# Altium footprint library DaughterBoard.PcbLib: 103 footprints (part 5 of 7)
Each footprint in its own frame and in the unit in brackets; x right, y up, seen from the top. Pads: shape width x height; smd on the part's side, far side on the other; paste and mask are expansions set on the pad; w line width, h text height; cw(c..) or ccw(c..) is an arc to the next point about the centre after c.
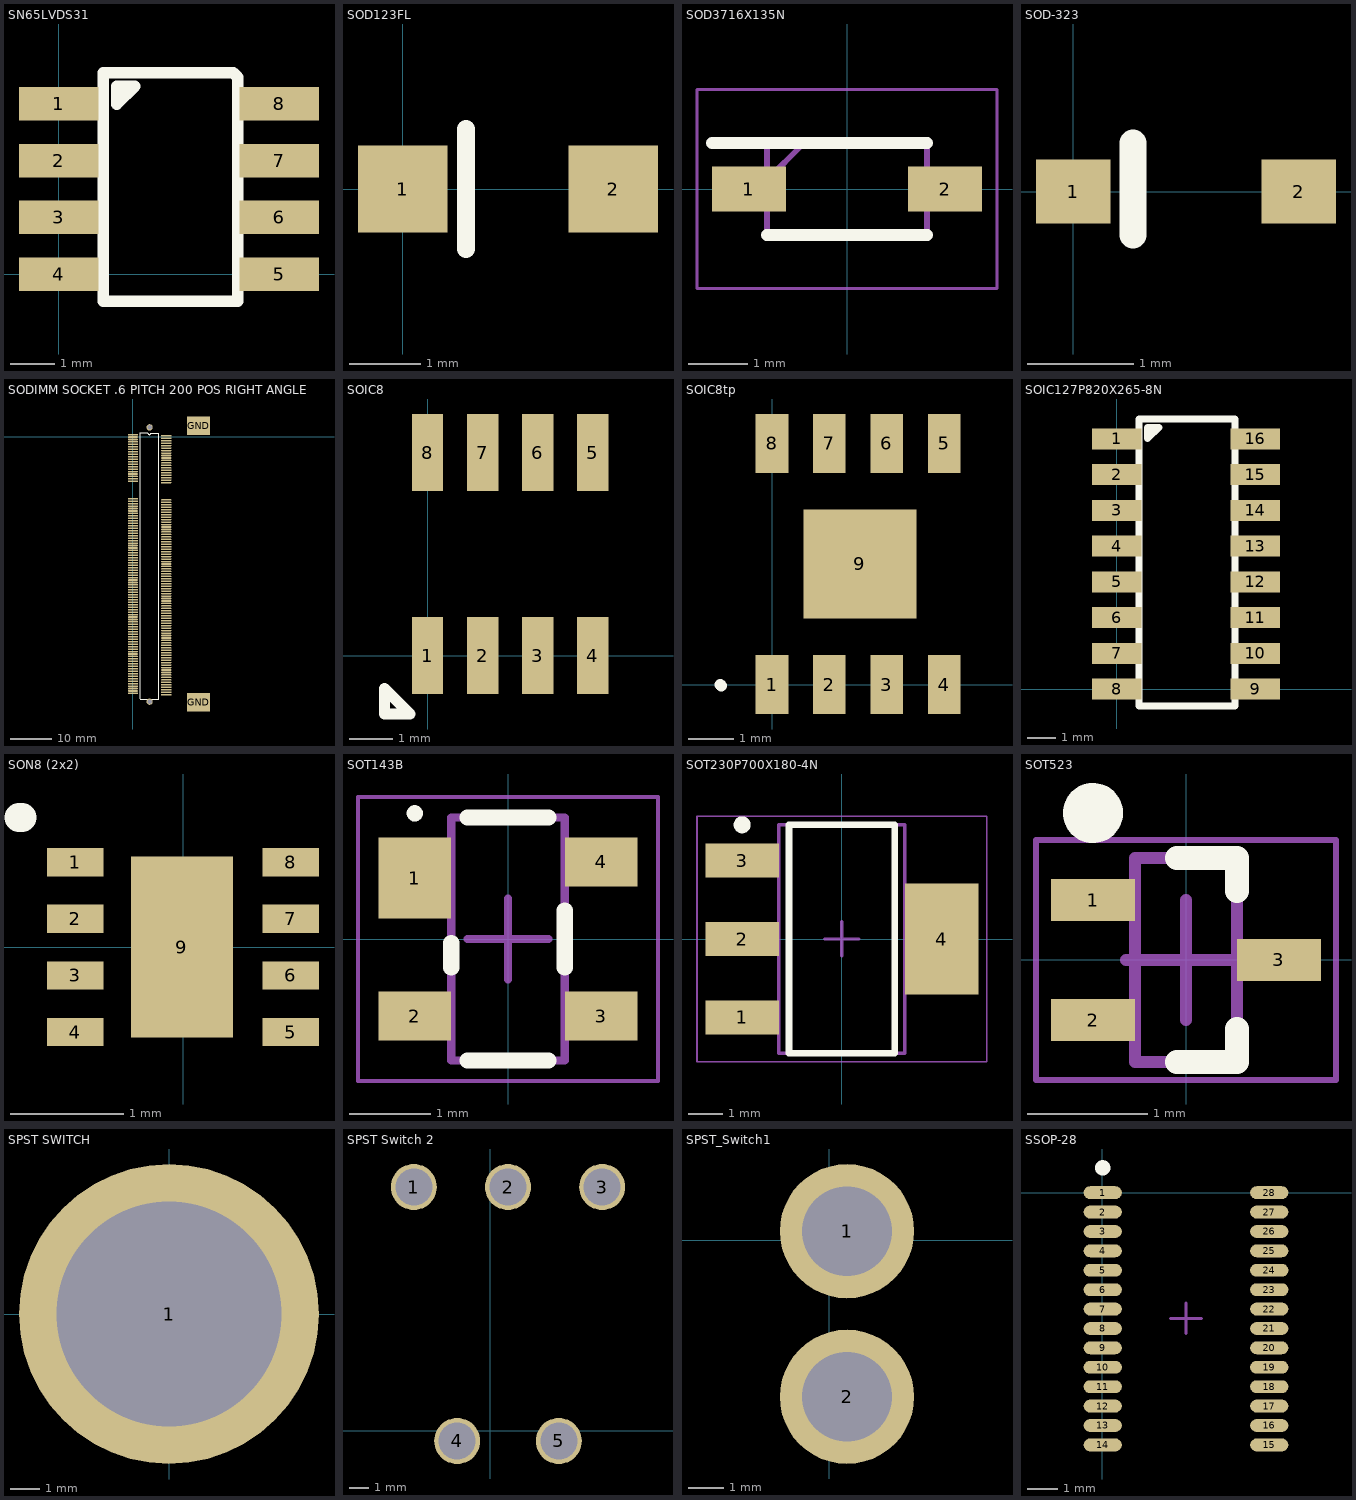
[diagram p4: the footprints below, top view; thin cyan lines are the x and y axes]

## SN65LVDS31 [mm]
pads (8):
  rect 1.77x0.75 smd: 1(0,3.81) 2(0,2.54) 3(0,1.27) 4(0,0) 5(4.928,0) 6(4.928,1.27) 7(4.928,2.54) 8(4.928,3.81)
Top Overlay:
  lines w0.254: 1,-0.6 4,-0.6 4,4.4 3.9,4.5 1,4.5 1,-0.6 ; 1.3,3.8 1.3,4.2 1.7,4.2 1.3,3.8
3D body "D8.stp": height 1.76, standoff 0, extent -0.599,-0.602 5.599,4.402

## SOD123FL [mm]
pads (2):
  rect 1.25x1.22 smd: 1(0,0) 2(2.95,0)
Top Overlay:
  lines w0.254: 0.889,-0.838 0.889,0.838
3D body "User Library-SOD-123FL CASE 498.step": height 0.95, standoff 0, extent -0.276,-0.825 3.324,0.825

## SOD3716X135N [mm]
pads (2):
  rect 1.25x0.75 smd: 1(-1.65,0) 2(1.65,0)
Top Overlay:
  lines w0.2: -2.275,0.775 1.35,0.775 ; -1.35,-0.775 1.35,-0.775
Mechanical 13:
  lines w0.1: -1.35,0.15 -0.725,0.775 ; -1.35,-0.775 -1.35,0.775 1.35,0.775 1.35,-0.775 -1.35,-0.775
Mechanical 15:
  lines w0.05: -2.525,-1.675 -2.525,1.675 2.525,1.675 2.525,-1.675 -2.525,-1.675
3D body "1n4148w.stp": height 1.35, standoff 0, extent -1.85,-0.775 1.85,0.775

## SOD-323 [mm]
pads (2):
  rect 0.7x0.6 smd: 1(0,0) 2(2.11,0)
Top Overlay:
  lines w0.254: 0.559,-0.406 0.559,0.457
3D body "User Library-SOD323-1.step": height 1.1, standoff 0, extent -0.233,-0.675 2.367,0.675

## SODIMM SOCKET .6 PITCH 200 POS RIGHT ANGLE [mm]
pads (204):
  rect 2.5x0.38 smd: 1(0,0.5)
  oval 2.5x0.38 smd: 2(8.1,0.2) 3(0,-0.1) 4(8.1,-0.4) 5(0,-0.7) 6(8.1,-1) 7(0,-1.3) 8(8.1,-1.6) 9(0,-1.9) 10(8.1,-2.2) 11(0,-2.5) 12(8.1,-2.8) 13(0,-3.1) 14(8.1,-3.4) 15(0,-3.7) 16(8.1,-4) 17(0,-4.3) 18(8.1,-4.6) 19(0,-4.9) 20(8.1,-5.2) 21(0,-5.5) 22(8.1,-5.8) 23(0,-6.1) 24(8.1,-6.4) 25(0,-6.7) 26(8.1,-7) 27(0,-7.3) 28(8.1,-7.6) 29(0,-7.9) 30(8.1,-8.2) 31(0,-8.5) 32(8.1,-8.8) 33(0,-9.1) 34(8.1,-9.4) 35(0,-9.7) 36(8.1,-10) 37(0,-10.3) 38(8.1,-10.6) 39(0,-10.9) 40(8.1,-11.2) 41(0,-15.1) 42(8.1,-15.4) 43(0,-15.7) 44(8.1,-16) 45(0,-16.3) 46(8.1,-16.6) 47(0,-16.9) 48(8.1,-17.2) 49(0,-17.5) 50(8.1,-17.8) 51(0,-18.1) 52(8.1,-18.4) 53(0,-18.7) 54(8.1,-19) 55(0,-19.3) 56(8.1,-19.6) 57(0,-19.9) 58(8.1,-20.2) 59(0,-20.5) 60(8.1,-20.8) 61(0,-21.1) 62(8.1,-21.4) 63(0,-21.7) 64(8.1,-22) 65(0,-22.3) 66(8.1,-22.6) 67(0,-22.9) 68(8.1,-23.2) 69(0,-23.5) 70(8.1,-23.8) 71(0,-24.1) 72(8.1,-24.4) 73(0,-24.7) 74(8.1,-25) 75(0,-25.3) 76(8.1,-25.6) 77(0,-25.9) 78(8.1,-26.2) 79(0,-26.5) 80(8.1,-26.8) 81(0,-27.1) 82(8.1,-27.4) 83(0,-27.7) 84(8.1,-28) 85(0,-28.3) 86(8.1,-28.6) 87(0,-28.9) 88(8.1,-29.2) 89(0,-29.5) 90(8.1,-29.8) 91(0,-30.1) 92(8.1,-30.4) 93(0,-30.7) 94(8.1,-31) 95(0,-31.3) 96(8.1,-31.6) 97(0,-31.9) 98(8.1,-32.2) 99(0,-32.5) 100(8.1,-32.8) 101(0,-33.1) 102(8.1,-33.4) 103(0,-33.7) 104(8.1,-34) 105(0,-34.3) 106(8.1,-34.6) 107(0,-34.9) 108(8.1,-35.2) 109(0,-35.5) 110(8.1,-35.8) 111(0,-36.1) 112(8.1,-36.4) 113(0,-36.7) 114(8.1,-37) 115(0,-37.3) 116(8.1,-37.6) 117(0,-37.9) 118(8.1,-38.2) 119(0,-38.5) 120(8.1,-38.8) 121(0,-39.1) 122(8.1,-39.4) 123(0,-39.7) 124(8.1,-40) 125(0,-40.3) 126(8.1,-40.6) 127(0,-40.9) 128(8.1,-41.2) 129(0,-41.5) 130(8.1,-41.8) 131(0,-42.1) 132(8.1,-42.4) 133(0,-42.7) 134(8.1,-43) 135(0,-43.3) 136(8.1,-43.6) 137(0,-43.9) 138(8.1,-44.2) 139(0,-44.5) 140(8.1,-44.8) 141(0,-45.1) 142(8.1,-45.4) 143(0,-45.7) 144(8.1,-46) 145(0,-46.3) 146(8.1,-46.6) 147(0,-46.9) 148(8.1,-47.2) 149(0,-47.5) 150(8.1,-47.8) 151(0,-48.1) 152(8.1,-48.4) 153(0,-48.7) 154(8.1,-49) 155(0,-49.3) 156(8.1,-49.6) 157(0,-49.9) 158(8.1,-50.2) 159(0,-50.5) 160(8.1,-50.8) 161(0,-51.1) 162(8.1,-51.4) 163(0,-51.7) 164(8.1,-52) 165(0,-52.3) 166(8.1,-52.6) 167(0,-52.9) 168(8.1,-53.2) 169(0,-53.5) 170(8.1,-53.8) 171(0,-54.1) 172(8.1,-54.4) 173(0,-54.7) 174(8.1,-55) 175(0,-55.3) 176(8.1,-55.6) 177(0,-55.9) 178(8.1,-56.2) 179(0,-56.5) 180(8.1,-56.8) 181(0,-57.1) 182(8.1,-57.4) 183(0,-57.7) 184(8.1,-58) 185(0,-58.3) 186(8.1,-58.6) 187(0,-58.9) 188(8.1,-59.2) 189(0,-59.5) 190(8.1,-59.8) 191(0,-60.1) 192(8.1,-60.4) 193(0,-60.7) 194(8.1,-61) 195(0,-61.3) 196(8.1,-61.6) 197(0,-61.9) 198(8.1,-62.2) 199(0,-62.5) 200(8.1,-62.8)
  rect 5.6x4.5 smd: GND(16,-64.7) GND(16,2.7)
  round 1.524 hole 1.1 unplated: SODIMM_MH1(4.05,2.25) SODIMM_MH2(4.05,-64.5)
Top Overlay:
  lines w0.2: 1.75,-63.9 6.25,-63.9 ; 1.75,-63.8 1.75,0.9 ; 3.65,0.85 ccw(c4,0.85) 4.35,0.85 ; 6.25,-63.8 6.25,0.85
  lines w0.254: 1.75,0.9 3.6,0.9 ; 4.35,0.85 6.2,0.85
3D body "c-1473005-4-j1-3d.stp": height 5.2, standoff -0.7, extent -0.9,-66.9 25.15,4.6

## SOIC8 [mm]
pads (8):
  rect 0.72x1.78 smd: 1(0,0) 2(1.27,0) 3(2.54,0) 4(3.81,0) 5(3.81,4.68) 6(2.54,4.68) 7(1.27,4.68) 8(0,4.68)
Top Overlay:
  lines w0.254: -0.991,-1.346 -0.991,-0.762 -0.406,-1.346 -0.991,-1.346
3D body "User Library-SOIC8_JEDEC_MS-012AA.step": height -0.37, standoff -2.13, extent -0.62,-0.737 4.38,5.462

## SOIC8tp [mm]
pads (9):
  rect 0.72x1.3 smd: 1(0,0) 2(1.27,0) 3(2.54,0) 4(3.81,0) 5(3.81,5.334) 6(2.54,5.334) 7(1.27,5.334) 8(0,5.334)
  rect 2.5x2.4 smd: 9(1.945,2.667)
Top Overlay:
  lines w0.254: -1.143,0 -1.118,-0.025
3D body "User Library-SOIC8_JEDEC_MS-012AA.step": height 1.36, standoff -0.39, extent -0.555,-0.433 4.445,5.767

## SOIC127P820X265-8N [mm] "SOIC, 8-Leads, Body 6.40x5.71mm, Pitch 1.27mm, IPC Medium Density"
height 2.65
pads (16):
  rect 1.77x0.75 smd: 1(0,8.89) 2(0,7.62) 3(0,6.35) 4(0,5.08) 5(0,3.81) 6(0,2.54) 7(0,1.27) 8(0,0) 9(4.928,0) 10(4.928,1.27) 11(4.928,2.54) 12(4.928,3.81) 13(4.928,5.08) 14(4.928,6.35) 15(4.928,7.62) 16(4.928,8.89)
Top Overlay:
  lines w0.254: 0.8,-0.6 0.8,9.6 4.2,9.6 4.2,-0.6 0.8,-0.6 ; 1.1,8.9 1.5,9.3 1.1,9.3 1.1,8.9
3D body "D16.stp": height 1.76, standoff 0, extent -0.599,-0.504 5.599,9.504

## SON8 (2x2) [mm]
pads (9):
  rect 0.5x0.25 smd: 1(-0.95,0.75) 2(-0.95,0.25) 3(-0.95,-0.25) 4(-0.95,-0.75) 5(0.95,-0.75) 6(0.95,-0.25) 7(0.95,0.25) 8(0.95,0.75)
  rect 0.9x1.6 smd: 9(-0.01,0)
Top Overlay:
  lines w0.254: -1.448,1.143 -1.422,1.143
3D body "User Library-SON8-2x2mm-1.step": height 0.77, standoff -0.03, extent -1,-1.01 1,0.99

## SOT143B [mm] "SOT143, 4-Leads, Body 2.90x2.30mm, Pitch 1.90mm, IPC Medium Density"
height 1.1
pads (4):
  rect 0.9x1 smd: 1(-1.15,0.75)
  rect 0.9x0.6 smd: 2(-1.15,-0.95) 3(1.15,-0.95) 4(1.15,0.95)
Top Overlay:
  circle w0.1: c-1.15,1.55 r0.05
  lines w0.2: -0.7,-0.35 -0.7,-0.05 ; -0.5,-1.5 0.5,-1.5 ; -0.5,1.5 0.5,1.5 ; 0.7,-0.35 0.7,0.35
Mechanical 13:
  lines w0.1: -0.7,-1.5 0.7,-1.5 0.7,1.5 -0.7,1.5 -0.7,-1.5
Mechanical 15:
  lines w0.05: -1.85,-1.75 1.85,-1.75 1.85,1.75 -1.85,1.75 -1.85,-1.75
  lines w0.1: -0.5,0 0.5,0 ; 0,-0.5 0,0.5
3D body "SOT143B.step": height 1.1, standoff 0, extent -1.15,-1.5 1.15,1.5

## SOT230P700X180-4N [mm] "SOT223, 4-Leads, Body 6.50x7.00mm (avg), Pitch 2.30mm, IPC Medium Density"
height 1.8
pads (4):
  rect 2.15x1 smd: 1(-2.925,-2.3) 2(-2.925,0) 3(-2.925,2.3)
  rect 2.15x3.25 smd: 4(2.925,0)
Top Overlay:
  circle w0.25: c-2.925,3.35 r0.125
  lines w0.2: -1.55,-3.35 -1.55,3.35 1.55,3.35 1.55,-3.35 -1.55,-3.35
Mechanical 13:
  lines w0.1: -1.85,-3.35 -1.85,3.35 1.85,3.35 1.85,-3.35 -1.85,-3.35
Mechanical 15:
  lines w0.05: -4.25,-3.6 -4.25,3.6 4.25,3.6 4.25,-3.6 -4.25,-3.6
  lines w0.1: -0.5,0 0.5,0 ; 0,-0.5 0,0.5
3D body "SOT230P700X180-4N.step": height 1.8, standoff 0, extent -3.5,-3.35 3.5,3.35

## SOT523 [mm]
height 0.9
pads (3):
  rect 0.7x0.35 smd: 1(-0.775,0.5) 2(-0.775,-0.5) 3(0.775,0)
Top Overlay:
  circle w0.25: c-0.775,1.225 r0.125
  lines w0.2: -0.075,-0.85 0.425,-0.85 0.425,-0.575 ; -0.075,0.85 0.425,0.85 0.425,0.575
Mechanical 13:
  lines w0.1: -0.425,-0.85 0.425,-0.85 0.425,0.85 -0.425,0.85 -0.425,-0.85
Mechanical 15:
  lines w0.05: -1.25,-1 1.25,-1 1.25,1 -1.25,1 -1.25,-1
  lines w0.1: -0.5,0 0.5,0 ; 0,-0.5 0,0.5
3D body "SOT523.step": height 0.9, standoff 0, extent -0.8,-0.848 0.8,0.848

## SPST SWITCH [mm]
pads (1):
  round 10.16 hole 7.62: 1(0,0)
3D body "M2011SS1W01.stp": height 20.02, standoff -13.54, extent -5.994,-6.502 5.994,6.502

## SPST Switch 2 [mm]
pads (5):
  round 2.3 hole 1.85: 1(-3.81,12.192) 2(0.9,12.192) 3(5.61,12.192) 4(-1.64,-0.508) 5(3.44,-0.508)
3D body "M2012S2A2W30.stp": height 3.8, standoff -8.44, extent -5.613,-13.39 7.391,12.954

## SPST_Switch1 [mil]
pads (2):
  round 150 hole 100: 1(20,10) 2(20,-175)
3D body "M2011SS1W01.stp": height 1162.95, standoff -158, extent -217,-427 254.98,85

## SSOP-28 [mm]
height 1.73
pads (28):
  oval 1.25x0.42 smd: 1(0.018,0) 2(0.018,-0.635) 3(0.018,-1.27) 4(0.018,-1.905) 5(0.018,-2.54) 6(0.018,-3.175) 7(0.018,-3.81) 8(0.018,-4.445) 9(0.018,-5.08) 10(0.018,-5.715) 11(0.018,-6.35) 12(0.018,-6.985) 13(0.018,-7.62) 14(0.018,-8.255) 15(5.468,-8.255) 16(5.468,-7.62) 17(5.468,-6.985) 18(5.468,-6.35) 19(5.468,-5.715) 20(5.468,-5.08) 21(5.468,-4.445) 22(5.468,-3.81) 23(5.468,-3.175) 24(5.468,-2.54) 25(5.468,-1.905) 26(5.468,-1.27) 27(5.468,-0.635) 28(5.468,0)
Top Overlay:
  circle w0.25: c0.018,0.813 r0.125
Mechanical 15:
  lines w0.1: 2.243,-4.115 3.243,-4.115 ; 2.743,-4.615 2.743,-3.615
3D body "SSOP-28b.step": height 1.73, standoff 0, extent -0.28,-9.089 5.715,0.911